# Altium footprint library ICs And Semiconductors SMD.PcbLib: 943 footprints (part 34 of 60)
Each footprint in its own frame and in the unit in brackets; x right, y up, seen from the top. Pads: shape width x height; smd on the part's side, far side on the other; paste and mask are expansions set on the pad; w line width, h text height; cw(c..) or ccw(c..) is an arc to the next point about the centre after c.
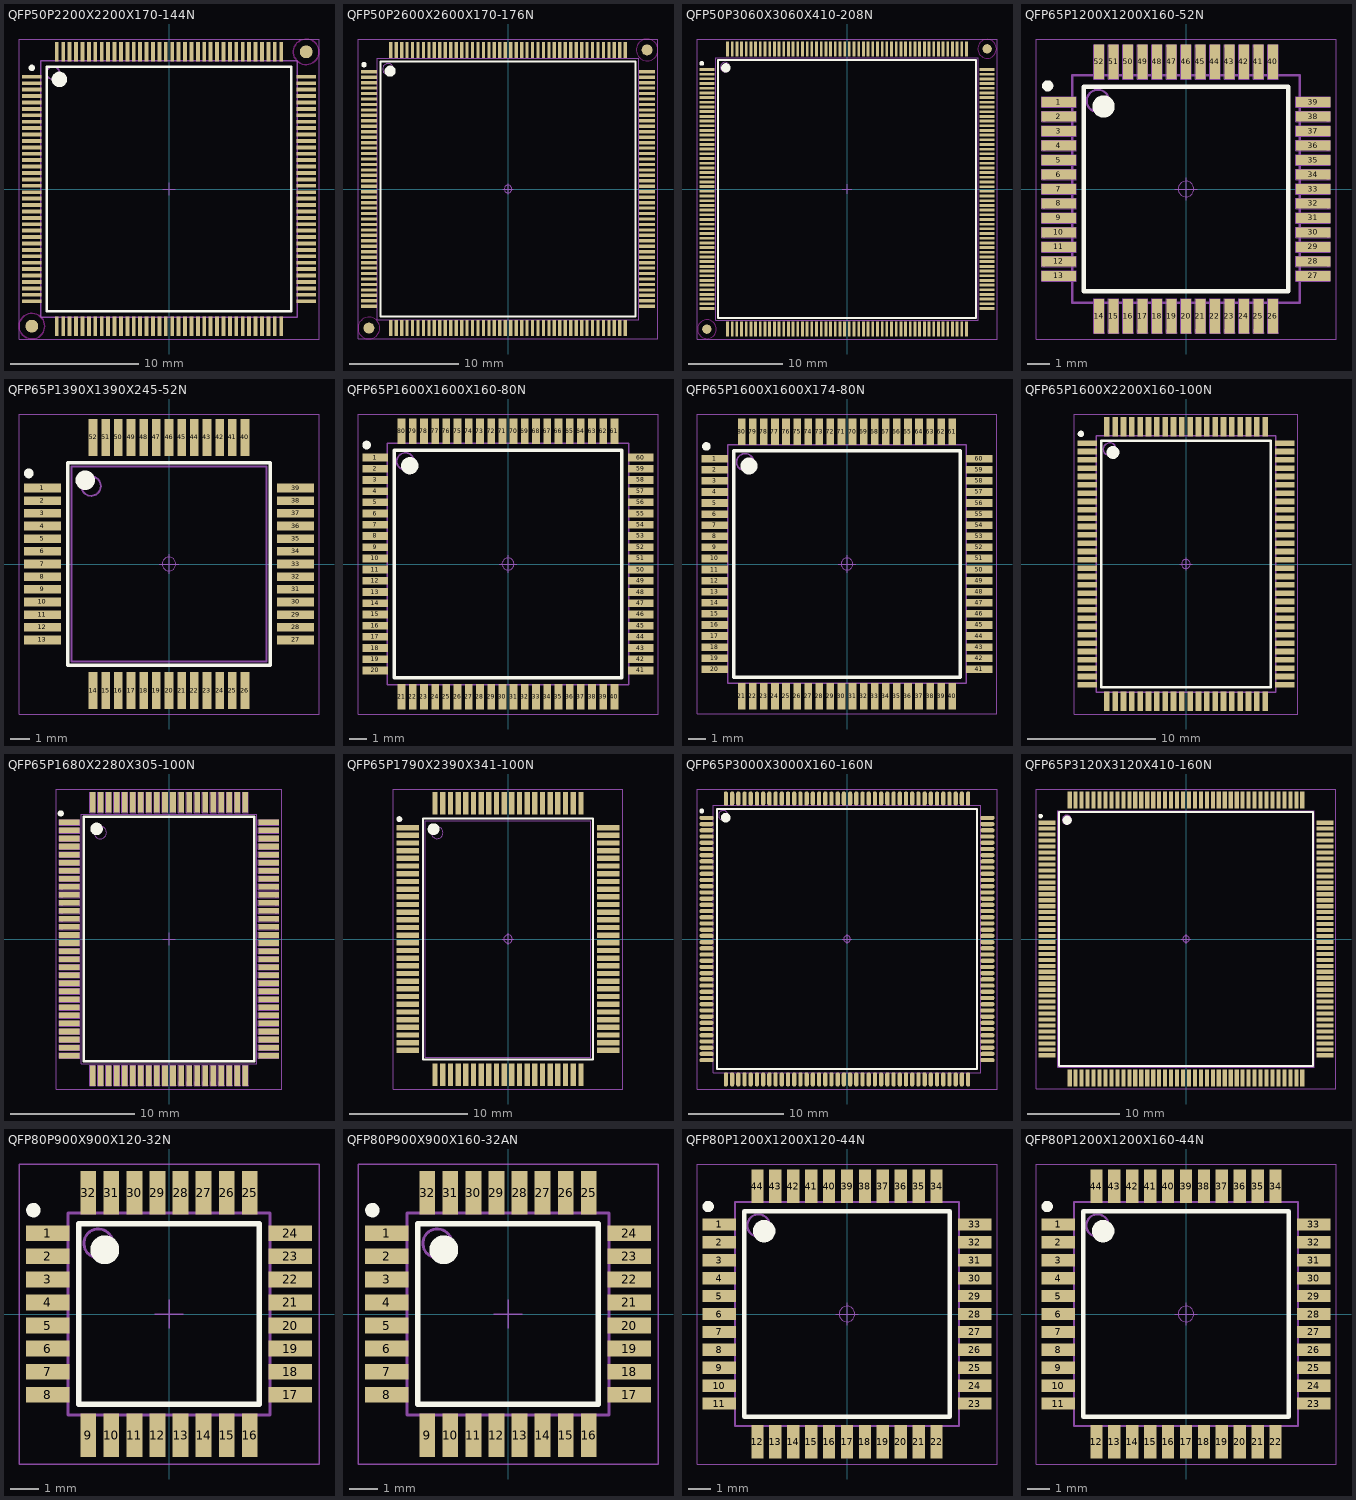
[diagram p33: the footprints below, top view; thin cyan lines are the x and y axes]

## QFP50P2200X2200X170-144N [mm] "QFP, 144-Leads, Body 20x20mm (BSC), Pitch 0.50mm, IPC Medium Density"
height 1.7
pads (146):
  rect 1.5x0.3 smd: 1(-10.7,8.75) 2(-10.7,8.25) 3(-10.7,7.75) 4(-10.7,7.25) 5(-10.7,6.75) 6(-10.7,6.25) 7(-10.7,5.75) 8(-10.7,5.25) 9(-10.7,4.75) 10(-10.7,4.25) 11(-10.7,3.75) 12(-10.7,3.25) 13(-10.7,2.75) 14(-10.7,2.25) 15(-10.7,1.75) 16(-10.7,1.25) 17(-10.7,0.75) 18(-10.7,0.25) 19(-10.7,-0.25) 20(-10.7,-0.75) 21(-10.7,-1.25) 22(-10.7,-1.75) 23(-10.7,-2.25) 24(-10.7,-2.75) 25(-10.7,-3.25) 26(-10.7,-3.75) 27(-10.7,-4.25) 28(-10.7,-4.75) 29(-10.7,-5.25) 30(-10.7,-5.75) 31(-10.7,-6.25) 32(-10.7,-6.75) 33(-10.7,-7.25) 34(-10.7,-7.75) 35(-10.7,-8.25) 36(-10.7,-8.75) 73(10.7,-8.75) 74(10.7,-8.25) 75(10.7,-7.75) 76(10.7,-7.25) 77(10.7,-6.75) 78(10.7,-6.25) 79(10.7,-5.75) 80(10.7,-5.25) 81(10.7,-4.75) 82(10.7,-4.25) 83(10.7,-3.75) 84(10.7,-3.25) 85(10.7,-2.75) 86(10.7,-2.25) 87(10.7,-1.75) 88(10.7,-1.25) 89(10.7,-0.75) 90(10.7,-0.25) 91(10.7,0.25) 92(10.7,0.75) 93(10.7,1.25) 94(10.7,1.75) 95(10.7,2.25) 96(10.7,2.75) 97(10.7,3.25) 98(10.7,3.75) 99(10.7,4.25) 100(10.7,4.75) 101(10.7,5.25) 102(10.7,5.75) 103(10.7,6.25) 104(10.7,6.75) 105(10.7,7.25) 106(10.7,7.75) 107(10.7,8.25) 108(10.7,8.75)
  rect 0.3x1.5 smd: 37(-8.75,-10.7) 38(-8.25,-10.7) 39(-7.75,-10.7) 40(-7.25,-10.7) 41(-6.75,-10.7) 42(-6.25,-10.7) 43(-5.75,-10.7) 44(-5.25,-10.7) 45(-4.75,-10.7) 46(-4.25,-10.7) 47(-3.75,-10.7) 48(-3.25,-10.7) 49(-2.75,-10.7) 50(-2.25,-10.7) 51(-1.75,-10.7) 52(-1.25,-10.7) 53(-0.75,-10.7) 54(-0.25,-10.7) 55(0.25,-10.7) 56(0.75,-10.7) 57(1.25,-10.7) 58(1.75,-10.7) 59(2.25,-10.7) 60(2.75,-10.7) 61(3.25,-10.7) 62(3.75,-10.7) 63(4.25,-10.7) 64(4.75,-10.7) 65(5.25,-10.7) 66(5.75,-10.7) 67(6.25,-10.7) 68(6.75,-10.7) 69(7.25,-10.7) 70(7.75,-10.7) 71(8.25,-10.7) 72(8.75,-10.7) 109(8.75,10.7) 110(8.25,10.7) 111(7.75,10.7) 112(7.25,10.7) 113(6.75,10.7) 114(6.25,10.7) 115(5.75,10.7) 116(5.25,10.7) 117(4.75,10.7) 118(4.25,10.7) 119(3.75,10.7) 120(3.25,10.7) 121(2.75,10.7) 122(2.25,10.7) 123(1.75,10.7) 124(1.25,10.7) 125(0.75,10.7) 126(0.25,10.7) 127(-0.25,10.7) 128(-0.75,10.7) 129(-1.25,10.7) 130(-1.75,10.7) 131(-2.25,10.7) 132(-2.75,10.7) 133(-3.25,10.7) 134(-3.75,10.7) 135(-4.25,10.7) 136(-4.75,10.7) 137(-5.25,10.7) 138(-5.75,10.7) 139(-6.25,10.7) 140(-6.75,10.7) 141(-7.25,10.7) 142(-7.75,10.7) 143(-8.25,10.7) 144(-8.75,10.7)
  round 1 smd paste-0.51 mask+0.5: FTG1(-10.7,-10.7) FTG2(10.7,10.7)
Top Layer keep-out:
  circle w0.1: c10.7,10.7 r1
  circle w0.1: c-10.7,-10.7 r1
Top Overlay:
  circle w0.6: c-8.55,8.55 r0.3
  circle w0.25: c-10.7,9.45 r0.125
  lines w0.2: -9.55,-9.55 9.55,-9.55 9.55,9.55 -9.55,9.55 -9.55,-9.55
Mechanical 14:
  circle w0.1: c-9.05,9.05 r0.5
  lines w0.1: -10,-10 10,-10 10,10 -10,10 -10,-10
Mechanical 15:
  lines w0.05: -0.5,0 0.5,0 ; 0,-0.5 0,0.5 ; -11.7,-11.7 11.7,-11.7 11.7,11.7 -11.7,11.7 -11.7,-11.7
3D body "QFP50P2200X2200X170-144N.stp": height 1.7, standoff 0, extent -11,-11 11,11

## QFP50P2600X2600X170-176N [mm] "QFP, 0.50mm Pitch, Square; 176 Pin, 24.00mm L X 24.00mm W X 1.70mm H Body, IPC Medium Density"
height 1.7
pads (178):
  rect 1.45x0.3 smd: 1(-12.75,10.75) 2(-12.75,10.25) 3(-12.75,9.75) 4(-12.75,9.25) 5(-12.75,8.75) 6(-12.75,8.25) 7(-12.75,7.75) 8(-12.75,7.25) 9(-12.75,6.75) 10(-12.75,6.25) 11(-12.75,5.75) 12(-12.75,5.25) 13(-12.75,4.75) 14(-12.75,4.25) 15(-12.75,3.75) 16(-12.75,3.25) 17(-12.75,2.75) 18(-12.75,2.25) 19(-12.75,1.75) 20(-12.75,1.25) 21(-12.75,0.75) 22(-12.75,0.25) 23(-12.75,-0.25) 24(-12.75,-0.75) 25(-12.75,-1.25) 26(-12.75,-1.75) 27(-12.75,-2.25) 28(-12.75,-2.75) 29(-12.75,-3.25) 30(-12.75,-3.75) 31(-12.75,-4.25) 32(-12.75,-4.75) 33(-12.75,-5.25) 34(-12.75,-5.75) 35(-12.75,-6.25) 36(-12.75,-6.75) 37(-12.75,-7.25) 38(-12.75,-7.75) 39(-12.75,-8.25) 40(-12.75,-8.75) 41(-12.75,-9.25) 42(-12.75,-9.75) 43(-12.75,-10.25) 44(-12.75,-10.75) 89(12.75,-10.75) 90(12.75,-10.25) 91(12.75,-9.75) 92(12.75,-9.25) 93(12.75,-8.75) 94(12.75,-8.25) 95(12.75,-7.75) 96(12.75,-7.25) 97(12.75,-6.75) 98(12.75,-6.25) 99(12.75,-5.75) 100(12.75,-5.25) 101(12.75,-4.75) 102(12.75,-4.25) 103(12.75,-3.75) 104(12.75,-3.25) 105(12.75,-2.75) 106(12.75,-2.25) 107(12.75,-1.75) 108(12.75,-1.25) 109(12.75,-0.75) 110(12.75,-0.25) 111(12.75,0.25) 112(12.75,0.75) 113(12.75,1.25) 114(12.75,1.75) 115(12.75,2.25) 116(12.75,2.75) 117(12.75,3.25) 118(12.75,3.75) 119(12.75,4.25) 120(12.75,4.75) 121(12.75,5.25) 122(12.75,5.75) 123(12.75,6.25) 124(12.75,6.75) 125(12.75,7.25) 126(12.75,7.75) 127(12.75,8.25) 128(12.75,8.75) 129(12.75,9.25) 130(12.75,9.75) 131(12.75,10.25) 132(12.75,10.75)
  rect 0.3x1.45 smd: 45(-10.75,-12.75) 46(-10.25,-12.75) 47(-9.75,-12.75) 48(-9.25,-12.75) 49(-8.75,-12.75) 50(-8.25,-12.75) 51(-7.75,-12.75) 52(-7.25,-12.75) 53(-6.75,-12.75) 54(-6.25,-12.75) 55(-5.75,-12.75) 56(-5.25,-12.75) 57(-4.75,-12.75) 58(-4.25,-12.75) 59(-3.75,-12.75) 60(-3.25,-12.75) 61(-2.75,-12.75) 62(-2.25,-12.75) 63(-1.75,-12.75) 64(-1.25,-12.75) 65(-0.75,-12.75) 66(-0.25,-12.75) 67(0.25,-12.75) 68(0.75,-12.75) 69(1.25,-12.75) 70(1.75,-12.75) 71(2.25,-12.75) 72(2.75,-12.75) 73(3.25,-12.75) 74(3.75,-12.75) 75(4.25,-12.75) 76(4.75,-12.75) 77(5.25,-12.75) 78(5.75,-12.75) 79(6.25,-12.75) 80(6.75,-12.75) 81(7.25,-12.75) 82(7.75,-12.75) 83(8.25,-12.75) 84(8.75,-12.75) 85(9.25,-12.75) 86(9.75,-12.75) 87(10.25,-12.75) 88(10.75,-12.75) 133(10.75,12.75) 134(10.25,12.75) 135(9.75,12.75) 136(9.25,12.75) 137(8.75,12.75) 138(8.25,12.75) 139(7.75,12.75) 140(7.25,12.75) 141(6.75,12.75) 142(6.25,12.75) 143(5.75,12.75) 144(5.25,12.75) 145(4.75,12.75) 146(4.25,12.75) 147(3.75,12.75) 148(3.25,12.75) 149(2.75,12.75) 150(2.25,12.75) 151(1.75,12.75) 152(1.25,12.75) 153(0.75,12.75) 154(0.25,12.75) 155(-0.25,12.75) 156(-0.75,12.75) 157(-1.25,12.75) 158(-1.75,12.75) 159(-2.25,12.75) 160(-2.75,12.75) 161(-3.25,12.75) 162(-3.75,12.75) 163(-4.25,12.75) 164(-4.75,12.75) 165(-5.25,12.75) 166(-5.75,12.75) 167(-6.25,12.75) 168(-6.75,12.75) 169(-7.25,12.75) 170(-7.75,12.75) 171(-8.25,12.75) 172(-8.75,12.75) 173(-9.25,12.75) 174(-9.75,12.75) 175(-10.25,12.75) 176(-10.75,12.75)
  round 1 smd paste-0.51 mask+0.5: FTG1(-12.75,-12.75) FTG2(12.75,12.75)
Top Layer keep-out:
  circle w0.1: c-12.75,-12.75 r1
  circle w0.1: c12.75,12.75 r1
Top Overlay:
  circle w0.5: c-10.8,10.8 r0.25
  circle w0.25: c-13.2,11.4 r0.125
  lines w0.2: -11.7,-11.7 -11.7,11.7 11.7,11.7 11.7,-11.7 -11.7,-11.7
Mechanical 14:
  circle w0.1: c-11,11 r0.5
  lines w0.1: -12,-12 -12,12 12,12 12,-12 -12,-12
Mechanical 15:
  circle w0.05: c0,0 r0.35
  lines w0.05: -0.5,0 0.5,0 ; 0,-0.5 0,0.5 ; -13.75,-13.75 -13.75,13.75 13.75,13.75 13.75,-13.75 -13.75,-13.75
3D body "QFP50P2600X2600X170-176N.stp": height 1.7, standoff 0, extent -13.025,-13.025 13.025,13.025

## QFP50P3060X3060X410-208N [mm] "SQFP, 208-Leads, Body 28x28mm (BSC), Pitch 0.50mm, IPC Medium Density"
height 4.1
pads (210):
  rect 1.6x0.3 smd: 1(-14.95,12.75) 2(-14.95,12.25) 3(-14.95,11.75) 4(-14.95,11.25) 5(-14.95,10.75) 6(-14.95,10.25) 7(-14.95,9.75) 8(-14.95,9.25) 9(-14.95,8.75) 10(-14.95,8.25) 11(-14.95,7.75) 12(-14.95,7.25) 13(-14.95,6.75) 14(-14.95,6.25) 15(-14.95,5.75) 16(-14.95,5.25) 17(-14.95,4.75) 18(-14.95,4.25) 19(-14.95,3.75) 20(-14.95,3.25) 21(-14.95,2.75) 22(-14.95,2.25) 23(-14.95,1.75) 24(-14.95,1.25) 25(-14.95,0.75) 26(-14.95,0.25) 27(-14.95,-0.25) 28(-14.95,-0.75) 29(-14.95,-1.25) 30(-14.95,-1.75) 31(-14.95,-2.25) 32(-14.95,-2.75) 33(-14.95,-3.25) 34(-14.95,-3.75) 35(-14.95,-4.25) 36(-14.95,-4.75) 37(-14.95,-5.25) 38(-14.95,-5.75) 39(-14.95,-6.25) 40(-14.95,-6.75) 41(-14.95,-7.25) 42(-14.95,-7.75) 43(-14.95,-8.25) 44(-14.95,-8.75) 45(-14.95,-9.25) 46(-14.95,-9.75) 47(-14.95,-10.25) 48(-14.95,-10.75) 49(-14.95,-11.25) 50(-14.95,-11.75) 51(-14.95,-12.25) 52(-14.95,-12.75) 105(14.95,-12.75) 106(14.95,-12.25) 107(14.95,-11.75) 108(14.95,-11.25) 109(14.95,-10.75) 110(14.95,-10.25) 111(14.95,-9.75) 112(14.95,-9.25) 113(14.95,-8.75) 114(14.95,-8.25) 115(14.95,-7.75) 116(14.95,-7.25) 117(14.95,-6.75) 118(14.95,-6.25) 119(14.95,-5.75) 120(14.95,-5.25) 121(14.95,-4.75) 122(14.95,-4.25) 123(14.95,-3.75) 124(14.95,-3.25) 125(14.95,-2.75) 126(14.95,-2.25) 127(14.95,-1.75) 128(14.95,-1.25) 129(14.95,-0.75) 130(14.95,-0.25) 131(14.95,0.25) 132(14.95,0.75) 133(14.95,1.25) 134(14.95,1.75) 135(14.95,2.25) 136(14.95,2.75) 137(14.95,3.25) 138(14.95,3.75) 139(14.95,4.25) 140(14.95,4.75) 141(14.95,5.25) 142(14.95,5.75) 143(14.95,6.25) 144(14.95,6.75) 145(14.95,7.25) 146(14.95,7.75) 147(14.95,8.25) 148(14.95,8.75) 149(14.95,9.25) 150(14.95,9.75) 151(14.95,10.25) 152(14.95,10.75) 153(14.95,11.25) 154(14.95,11.75) 155(14.95,12.25) 156(14.95,12.75)
  rect 0.3x1.6 smd: 53(-12.75,-14.95) 54(-12.25,-14.95) 55(-11.75,-14.95) 56(-11.25,-14.95) 57(-10.75,-14.95) 58(-10.25,-14.95) 59(-9.75,-14.95) 60(-9.25,-14.95) 61(-8.75,-14.95) 62(-8.25,-14.95) 63(-7.75,-14.95) 64(-7.25,-14.95) 65(-6.75,-14.95) 66(-6.25,-14.95) 67(-5.75,-14.95) 68(-5.25,-14.95) 69(-4.75,-14.95) 70(-4.25,-14.95) 71(-3.75,-14.95) 72(-3.25,-14.95) 73(-2.75,-14.95) 74(-2.25,-14.95) 75(-1.75,-14.95) 76(-1.25,-14.95) 77(-0.75,-14.95) 78(-0.25,-14.95) 79(0.25,-14.95) 80(0.75,-14.95) 81(1.25,-14.95) 82(1.75,-14.95) 83(2.25,-14.95) 84(2.75,-14.95) 85(3.25,-14.95) 86(3.75,-14.95) 87(4.25,-14.95) 88(4.75,-14.95) 89(5.25,-14.95) 90(5.75,-14.95) 91(6.25,-14.95) 92(6.75,-14.95) 93(7.25,-14.95) 94(7.75,-14.95) 95(8.25,-14.95) 96(8.75,-14.95) 97(9.25,-14.95) 98(9.75,-14.95) 99(10.25,-14.95) 100(10.75,-14.95) 101(11.25,-14.95) 102(11.75,-14.95) 103(12.25,-14.95) 104(12.75,-14.95) 157(12.75,14.95) 158(12.25,14.95) 159(11.75,14.95) 160(11.25,14.95) 161(10.75,14.95) 162(10.25,14.95) 163(9.75,14.95) 164(9.25,14.95) 165(8.75,14.95) 166(8.25,14.95) 167(7.75,14.95) 168(7.25,14.95) 169(6.75,14.95) 170(6.25,14.95) 171(5.75,14.95) 172(5.25,14.95) 173(4.75,14.95) 174(4.25,14.95) 175(3.75,14.95) 176(3.25,14.95) 177(2.75,14.95) 178(2.25,14.95) 179(1.75,14.95) 180(1.25,14.95) 181(0.75,14.95) 182(0.25,14.95) 183(-0.25,14.95) 184(-0.75,14.95) 185(-1.25,14.95) 186(-1.75,14.95) 187(-2.25,14.95) 188(-2.75,14.95) 189(-3.25,14.95) 190(-3.75,14.95) 191(-4.25,14.95) 192(-4.75,14.95) 193(-5.25,14.95) 194(-5.75,14.95) 195(-6.25,14.95) 196(-6.75,14.95) 197(-7.25,14.95) 198(-7.75,14.95) 199(-8.25,14.95) 200(-8.75,14.95) 201(-9.25,14.95) 202(-9.75,14.95) 203(-10.25,14.95) 204(-10.75,14.95) 205(-11.25,14.95) 206(-11.75,14.95) 207(-12.25,14.95) 208(-12.75,14.95)
  round 1 smd paste-0.51 mask+0.5: FTG1(-14.95,-14.95) FTG2(14.95,14.95)
Top Layer keep-out:
  circle w0.1: c14.95,14.95 r1
  circle w0.1: c-14.95,-14.95 r1
Top Overlay:
  circle w0.5: c-12.925,12.925 r0.25
  circle w0.25: c-15.5,13.4 r0.125
  lines w0.2: -13.75,-13.75 -13.75,13.75 13.75,13.75 13.75,-13.75 -13.75,-13.75
Mechanical 14:
  circle w0.1: c-13,13 r0.5
  lines w0.1: -14,-14 -14,14 14,14 14,-14 -14,-14
Mechanical 15:
  lines w0.05: -0.5,0 0.5,0 ; 0,-0.5 0,0.5 ; -16,-16 -16,16 16,16 16,-16 -16,-16
3D body "QFP50P3060X3060X410-208N.stp": height 4.1, standoff 0, extent -15.3,-15.3 15.3,15.3

## QFP65P1200X1200X160-52N [mm] "QFP, 0.65mm PQFP, 0.65mm Pitch, Square, 13 pin X 13 Pin, 12.00mm X 12.00mm X 1.60mm Body, IPC Medium Density"
height 1.6
pads (52):
  rect 1.55x0.45 smd: 1(-5.7,3.9) 2(-5.7,3.25) 3(-5.7,2.6) 4(-5.7,1.95) 5(-5.7,1.3) 6(-5.7,0.65) 7(-5.7,0) 8(-5.7,-0.65) 9(-5.7,-1.3) 10(-5.7,-1.95) 11(-5.7,-2.6) 12(-5.7,-3.25) 13(-5.7,-3.9) 27(5.7,-3.9) 28(5.7,-3.25) 29(5.7,-2.6) 30(5.7,-1.95) 31(5.7,-1.3) 32(5.7,-0.65) 33(5.7,0) 34(5.7,0.65) 35(5.7,1.3) 36(5.7,1.95) 37(5.7,2.6) 38(5.7,3.25) 39(5.7,3.9)
  rect 0.45x1.55 smd: 14(-3.9,-5.7) 15(-3.25,-5.7) 16(-2.6,-5.7) 17(-1.95,-5.7) 18(-1.3,-5.7) 19(-0.65,-5.7) 20(0,-5.7) 21(0.65,-5.7) 22(1.3,-5.7) 23(1.95,-5.7) 24(2.6,-5.7) 25(3.25,-5.7) 26(3.9,-5.7) 40(3.9,5.7) 41(3.25,5.7) 42(2.6,5.7) 43(1.95,5.7) 44(1.3,5.7) 45(0.65,5.7) 46(0,5.7) 47(-0.65,5.7) 48(-1.3,5.7) 49(-1.95,5.7) 50(-2.6,5.7) 51(-3.25,5.7) 52(-3.9,5.7)
Top Overlay:
  circle w0.5: c-3.7,3.7 r0.25
  circle w0.25: c-6.2,4.625 r0.125
  lines w0.2: -4.575,-4.575 -4.575,4.575 4.575,4.575 4.575,-4.575 -4.575,-4.575
Mechanical 8:
  drawing of 316 lines, arcs and shapes, not listed
Mechanical 14:
  circle w0.1: c-3.95,3.95 r0.5
  lines w0.1: -5,-5.1 5.1,-5.1 ; 5.1,-5.1 5.1,5.1 -5.1,5.1 -5.1,-5.1 5.1,-5.1
Mechanical 15:
  circle w0.05: c0,0 r0.35
  lines w0.05: -0.5,0 0.5,0 ; 0,-0.5 0,0.5 ; -6.725,-6.725 -6.725,6.725 6.725,6.725 6.725,-6.725 -6.725,-6.725
3D body "QFP65P1200X1200X160-52N.stp": height 1.6, standoff 0, extent -6.098,-6.098 6.099,6.099

## QFP65P1390X1390X245-52N [mm] "QFP, 0.65mm Pitch, Square; 52 Pin, 10.00mm L X 10.00mm W X 2.45mm H body, IPC Medium Density"
height 2.45
pads (52):
  rect 1.9x0.45 smd: 1(-6.5,3.9) 2(-6.5,3.25) 3(-6.5,2.6) 4(-6.5,1.95) 5(-6.5,1.3) 6(-6.5,0.65) 7(-6.5,0) 8(-6.5,-0.65) 9(-6.5,-1.3) 10(-6.5,-1.95) 11(-6.5,-2.6) 12(-6.5,-3.25) 13(-6.5,-3.9) 27(6.5,-3.9) 28(6.5,-3.25) 29(6.5,-2.6) 30(6.5,-1.95) 31(6.5,-1.3) 32(6.5,-0.65) 33(6.5,0) 34(6.5,0.65) 35(6.5,1.3) 36(6.5,1.95) 37(6.5,2.6) 38(6.5,3.25) 39(6.5,3.9)
  rect 0.45x1.9 smd: 14(-3.9,-6.5) 15(-3.25,-6.5) 16(-2.6,-6.5) 17(-1.95,-6.5) 18(-1.3,-6.5) 19(-0.65,-6.5) 20(0,-6.5) 21(0.65,-6.5) 22(1.3,-6.5) 23(1.95,-6.5) 24(2.6,-6.5) 25(3.25,-6.5) 26(3.9,-6.5) 40(3.9,6.5) 41(3.25,6.5) 42(2.6,6.5) 43(1.95,6.5) 44(1.3,6.5) 45(0.65,6.5) 46(0,6.5) 47(-0.65,6.5) 48(-1.3,6.5) 49(-1.95,6.5) 50(-2.6,6.5) 51(-3.25,6.5) 52(-3.9,6.5)
Top Overlay:
  circle w0.5: c-4.3,4.3 r0.25
  circle w0.25: c-7.2,4.65 r0.125
  lines w0.2: -5.2,-5.2 -5.2,5.2 5.2,5.2 5.2,-5.2 -5.2,-5.2
Mechanical 14:
  circle w0.1: c-4,4 r0.5
  lines w0.1: -5,-5 -5,5 5,5 5,-5 -5,-5
Mechanical 15:
  circle w0.05: c0,0 r0.35
  lines w0.05: -0.5,0 0.5,0 ; 0,-0.5 0,0.5 ; -7.7,-7.7 -7.7,7.7 7.7,7.7 7.7,-7.7 -7.7,-7.7
3D body "QFP65P1390X1390X245-52N.stp": height 2.45, standoff 0, extent -7.075,-7.075 7.075,7.075

## QFP65P1600X1600X160-80N [mm] "QFP, 0.65mm Pitch, Square; 80 Pin,14.00mm L X 14.00mm W X 1.60mm H body, IPC Medium Density"
height 1.6
pads (80):
  rect 1.5x0.45 smd: 1(-7.7,6.175) 2(-7.7,5.525) 3(-7.7,4.875) 4(-7.7,4.225) 5(-7.7,3.575) 6(-7.7,2.925) 7(-7.7,2.275) 8(-7.7,1.625) 9(-7.7,0.975) 10(-7.7,0.325) 11(-7.7,-0.325) 12(-7.7,-0.975) 13(-7.7,-1.625) 14(-7.7,-2.275) 15(-7.7,-2.925) 16(-7.7,-3.575) 17(-7.7,-4.225) 18(-7.7,-4.875) 19(-7.7,-5.525) 20(-7.7,-6.175) 41(7.7,-6.175) 42(7.7,-5.525) 43(7.7,-4.875) 44(7.7,-4.225) 45(7.7,-3.575) 46(7.7,-2.925) 47(7.7,-2.275) 48(7.7,-1.625) 49(7.7,-0.975) 50(7.7,-0.325) 51(7.7,0.325) 52(7.7,0.975) 53(7.7,1.625) 54(7.7,2.275) 55(7.7,2.925) 56(7.7,3.575) 57(7.7,4.225) 58(7.7,4.875) 59(7.7,5.525) 60(7.7,6.175)
  rect 0.45x1.5 smd: 21(-6.175,-7.7) 22(-5.525,-7.7) 23(-4.875,-7.7) 24(-4.225,-7.7) 25(-3.575,-7.7) 26(-2.925,-7.7) 27(-2.275,-7.7) 28(-1.625,-7.7) 29(-0.975,-7.7) 30(-0.325,-7.7) 31(0.325,-7.7) 32(0.975,-7.7) 33(1.625,-7.7) 34(2.275,-7.7) 35(2.925,-7.7) 36(3.575,-7.7) 37(4.225,-7.7) 38(4.875,-7.7) 39(5.525,-7.7) 40(6.175,-7.7) 61(6.175,7.7) 62(5.525,7.7) 63(4.875,7.7) 64(4.225,7.7) 65(3.575,7.7) 66(2.925,7.7) 67(2.275,7.7) 68(1.625,7.7) 69(0.975,7.7) 70(0.325,7.7) 71(-0.325,7.7) 72(-0.975,7.7) 73(-1.625,7.7) 74(-2.275,7.7) 75(-2.925,7.7) 76(-3.575,7.7) 77(-4.225,7.7) 78(-4.875,7.7) 79(-5.525,7.7) 80(-6.175,7.7)
Top Overlay:
  circle w0.25: c-8.2,6.9 r0.125
  circle w0.5: c-5.7,5.7 r0.25
  lines w0.2: -6.6,-6.6 6.6,-6.6 6.6,6.6 -6.6,6.6 -6.6,-6.6
Mechanical 14:
  circle w0.1: c-5.95,5.95 r0.5
  lines w0.1: -7,-7 7,-7 7,7 -7,7 -7,-7
Mechanical 15:
  circle w0.05: c0,0 r0.35
  lines w0.05: -0.5,0 0.5,0 ; 0,-0.5 0,0.5 ; -8.7,-8.7 8.7,-8.7 8.7,8.7 -8.7,8.7 -8.7,-8.7
3D body "QFP65P1600X1600X160-80N.stp": height 1.6, standoff 0, extent -8.023,-8.023 8.024,8.024

## QFP65P1600X1600X174-80N [mm] "QFP, 0.65mm Pitch, Square; 80 Pin, 14.00mm L X 14.00mm W X 1.74mm H Body, IPC Medium Density"
height 1.74
pads (80):
  rect 1.55x0.45 smd: 1(-7.75,6.175) 2(-7.75,5.525) 3(-7.75,4.875) 4(-7.75,4.225) 5(-7.75,3.575) 6(-7.75,2.925) 7(-7.75,2.275) 8(-7.75,1.625) 9(-7.75,0.975) 10(-7.75,0.325) 11(-7.75,-0.325) 12(-7.75,-0.975) 13(-7.75,-1.625) 14(-7.75,-2.275) 15(-7.75,-2.925) 16(-7.75,-3.575) 17(-7.75,-4.225) 18(-7.75,-4.875) 19(-7.75,-5.525) 20(-7.75,-6.175) 41(7.75,-6.175) 42(7.75,-5.525) 43(7.75,-4.875) 44(7.75,-4.225) 45(7.75,-3.575) 46(7.75,-2.925) 47(7.75,-2.275) 48(7.75,-1.625) 49(7.75,-0.975) 50(7.75,-0.325) 51(7.75,0.325) 52(7.75,0.975) 53(7.75,1.625) 54(7.75,2.275) 55(7.75,2.925) 56(7.75,3.575) 57(7.75,4.225) 58(7.75,4.875) 59(7.75,5.525) 60(7.75,6.175)
  rect 0.45x1.55 smd: 21(-6.175,-7.75) 22(-5.525,-7.75) 23(-4.875,-7.75) 24(-4.225,-7.75) 25(-3.575,-7.75) 26(-2.925,-7.75) 27(-2.275,-7.75) 28(-1.625,-7.75) 29(-0.975,-7.75) 30(-0.325,-7.75) 31(0.325,-7.75) 32(0.975,-7.75) 33(1.625,-7.75) 34(2.275,-7.75) 35(2.925,-7.75) 36(3.575,-7.75) 37(4.225,-7.75) 38(4.875,-7.75) 39(5.525,-7.75) 40(6.175,-7.75) 61(6.175,7.75) 62(5.525,7.75) 63(4.875,7.75) 64(4.225,7.75) 65(3.575,7.75) 66(2.925,7.75) 67(2.275,7.75) 68(1.625,7.75) 69(0.975,7.75) 70(0.325,7.75) 71(-0.325,7.75) 72(-0.975,7.75) 73(-1.625,7.75) 74(-2.275,7.75) 75(-2.925,7.75) 76(-3.575,7.75) 77(-4.225,7.75) 78(-4.875,7.75) 79(-5.525,7.75) 80(-6.175,7.75)
Top Overlay:
  circle w0.5: c-5.75,5.75 r0.25
  circle w0.25: c-8.25,6.9 r0.125
  lines w0.2: -6.65,-6.65 -6.65,6.65 6.65,6.65 6.65,-6.65 -6.65,-6.65
Mechanical 14:
  circle w0.1: c-5.975,5.975 r0.5
  lines w0.1: -7,-7 -7,7 7,7 7,-7 -7,-7
Mechanical 15:
  circle w0.05: c0,0 r0.35
  lines w0.05: -0.5,0 0.5,0 ; 0,-0.5 0,0.5 ; -8.8,-8.8 -8.8,8.8 8.8,8.8 8.8,-8.8 -8.8,-8.8
3D body "QFP65P1600X1600X174-80N.stp": height 1.74, standoff 0, extent -8.023,-8.023 8.024,8.024

## QFP65P1600X2200X160-100N [mm] "QFP, 0.65mm Pitch, Rect.; 100 Pin, 20.00mm L X 14.00mm W X 1.60mm H body, IPC Medium Density"
height 1.6
pads (100):
  rect 1.5x0.45 smd: 1(-7.7,9.425) 2(-7.7,8.775) 3(-7.7,8.125) 4(-7.7,7.475) 5(-7.7,6.825) 6(-7.7,6.175) 7(-7.7,5.525) 8(-7.7,4.875) 9(-7.7,4.225) 10(-7.7,3.575) 11(-7.7,2.925) 12(-7.7,2.275) 13(-7.7,1.625) 14(-7.7,0.975) 15(-7.7,0.325) 16(-7.7,-0.325) 17(-7.7,-0.975) 18(-7.7,-1.625) 19(-7.7,-2.275) 20(-7.7,-2.925) 21(-7.7,-3.575) 22(-7.7,-4.225) 23(-7.7,-4.875) 24(-7.7,-5.525) 25(-7.7,-6.175) 26(-7.7,-6.825) 27(-7.7,-7.475) 28(-7.7,-8.125) 29(-7.7,-8.775) 30(-7.7,-9.425) 51(7.7,-9.425) 52(7.7,-8.775) 53(7.7,-8.125) 54(7.7,-7.475) 55(7.7,-6.825) 56(7.7,-6.175) 57(7.7,-5.525) 58(7.7,-4.875) 59(7.7,-4.225) 60(7.7,-3.575) 61(7.7,-2.925) 62(7.7,-2.275) 63(7.7,-1.625) 64(7.7,-0.975) 65(7.7,-0.325) 66(7.7,0.325) 67(7.7,0.975) 68(7.7,1.625) 69(7.7,2.275) 70(7.7,2.925) 71(7.7,3.575) 72(7.7,4.225) 73(7.7,4.875) 74(7.7,5.525) 75(7.7,6.175) 76(7.7,6.825) 77(7.7,7.475) 78(7.7,8.125) 79(7.7,8.775) 80(7.7,9.425)
  rect 0.45x1.5 smd: 31(-6.175,-10.7) 32(-5.525,-10.7) 33(-4.875,-10.7) 34(-4.225,-10.7) 35(-3.575,-10.7) 36(-2.925,-10.7) 37(-2.275,-10.7) 38(-1.625,-10.7) 39(-0.975,-10.7) 40(-0.325,-10.7) 41(0.325,-10.7) 42(0.975,-10.7) 43(1.625,-10.7) 44(2.275,-10.7) 45(2.925,-10.7) 46(3.575,-10.7) 47(4.225,-10.7) 48(4.875,-10.7) 49(5.525,-10.7) 50(6.175,-10.7) 81(6.175,10.7) 82(5.525,10.7) 83(4.875,10.7) 84(4.225,10.7) 85(3.575,10.7) 86(2.925,10.7) 87(2.275,10.7) 88(1.625,10.7) 89(0.975,10.7) 90(0.325,10.7) 91(-0.325,10.7) 92(-0.975,10.7) 93(-1.625,10.7) 94(-2.275,10.7) 95(-2.925,10.7) 96(-3.575,10.7) 97(-4.225,10.7) 98(-4.875,10.7) 99(-5.525,10.7) 100(-6.175,10.7)
Top Overlay:
  circle w0.5: c-5.7,8.7 r0.25
  circle w0.25: c-8.2,10.15 r0.125
  lines w0.2: -6.6,-9.6 6.6,-9.6 6.6,9.6 -6.6,9.6 -6.6,-9.6
Mechanical 14:
  circle w0.1: c-5.95,8.95 r0.5
  lines w0.1: -7,-10 7,-10 7,10 -7,10 -7,-10
Mechanical 15:
  circle w0.05: c0,0 r0.35
  lines w0.05: -0.5,0 0.5,0 ; 0,-0.5 0,0.5 ; -8.7,-11.7 8.7,-11.7 8.7,11.7 -8.7,11.7 -8.7,-11.7
3D body "QFP65P1600X2200X160-100N.stp": height 1.55, standoff 0, extent -8.023,-11.023 8.024,11.024

## QFP65P1680X2280X305-100N [mm] "QFP, 0.65mm Pitch, Rect.; 100 Pin,20.00mm L X 14.00mm W X 3.05mm H Body, IPC Medium Density"
height 3.05
pads (100):
  rect 1.65x0.45 smd: 1(-8.05,9.425) 2(-8.05,8.775) 3(-8.05,8.125) 4(-8.05,7.475) 5(-8.05,6.825) 6(-8.05,6.175) 7(-8.05,5.525) 8(-8.05,4.875) 9(-8.05,4.225) 10(-8.05,3.575) 11(-8.05,2.925) 12(-8.05,2.275) 13(-8.05,1.625) 14(-8.05,0.975) 15(-8.05,0.325) 16(-8.05,-0.325) 17(-8.05,-0.975) 18(-8.05,-1.625) 19(-8.05,-2.275) 20(-8.05,-2.925) 21(-8.05,-3.575) 22(-8.05,-4.225) 23(-8.05,-4.875) 24(-8.05,-5.525) 25(-8.05,-6.175) 26(-8.05,-6.825) 27(-8.05,-7.475) 28(-8.05,-8.125) 29(-8.05,-8.775) 30(-8.05,-9.425) 51(8.05,-9.425) 52(8.05,-8.775) 53(8.05,-8.125) 54(8.05,-7.475) 55(8.05,-6.825) 56(8.05,-6.175) 57(8.05,-5.525) 58(8.05,-4.875) 59(8.05,-4.225) 60(8.05,-3.575) 61(8.05,-2.925) 62(8.05,-2.275) 63(8.05,-1.625) 64(8.05,-0.975) 65(8.05,-0.325) 66(8.05,0.325) 67(8.05,0.975) 68(8.05,1.625) 69(8.05,2.275) 70(8.05,2.925) 71(8.05,3.575) 72(8.05,4.225) 73(8.05,4.875) 74(8.05,5.525) 75(8.05,6.175) 76(8.05,6.825) 77(8.05,7.475) 78(8.05,8.125) 79(8.05,8.775) 80(8.05,9.425)
  rect 0.45x1.65 smd: 31(-6.175,-11.05) 32(-5.525,-11.05) 33(-4.875,-11.05) 34(-4.225,-11.05) 35(-3.575,-11.05) 36(-2.925,-11.05) 37(-2.275,-11.05) 38(-1.625,-11.05) 39(-0.975,-11.05) 40(-0.325,-11.05) 41(0.325,-11.05) 42(0.975,-11.05) 43(1.625,-11.05) 44(2.275,-11.05) 45(2.925,-11.05) 46(3.575,-11.05) 47(4.225,-11.05) 48(4.875,-11.05) 49(5.525,-11.05) 50(6.175,-11.05) 81(6.175,11.05) 82(5.525,11.05) 83(4.875,11.05) 84(4.225,11.05) 85(3.575,11.05) 86(2.925,11.05) 87(2.275,11.05) 88(1.625,11.05) 89(0.975,11.05) 90(0.325,11.05) 91(-0.325,11.05) 92(-0.975,11.05) 93(-1.625,11.05) 94(-2.275,11.05) 95(-2.925,11.05) 96(-3.575,11.05) 97(-4.225,11.05) 98(-4.875,11.05) 99(-5.525,11.05) 100(-6.175,11.05)
Top Overlay:
  circle w0.5: c-5.85,8.9 r0.25
  circle w0.25: c-8.75,10.15 r0.125
  lines w0.2: -6.875,-9.875 6.875,-9.875 6.875,9.875 -6.875,9.875 -6.875,-9.875
Mechanical 8:
  drawing of 604 lines, arcs and shapes, not listed
Mechanical 14:
  circle w0.1: c-5.55,8.6 r0.5
  lines w0.1: -7.1,-10.1 -7.1,10.1 7.1,10.1 7.1,-10.1 -7.1,-10.1
Mechanical 15:
  lines w0.05: -9.125,-12.125 9.125,-12.125 9.125,12.125 -9.125,12.125 -9.125,-12.125
3D body "QFP65P1680X2280X305-100N.stp": height 3.05, standoff 0, extent -8.46,-11.46 8.461,11.461

## QFP65P1790X2390X341-100N [mm] "QFP, 0.65mm Pitch, Rect.; 100 Pin,20.00mm L X 14.00mm W X 3.41mm H Body, IPC Medium Density"
height 3.41
pads (100):
  rect 1.9x0.45 smd: 1(-8.5,9.425) 2(-8.5,8.775) 3(-8.5,8.125) 4(-8.5,7.475) 5(-8.5,6.825) 6(-8.5,6.175) 7(-8.5,5.525) 8(-8.5,4.875) 9(-8.5,4.225) 10(-8.5,3.575) 11(-8.5,2.925) 12(-8.5,2.275) 13(-8.5,1.625) 14(-8.5,0.975) 15(-8.5,0.325) 16(-8.5,-0.325) 17(-8.5,-0.975) 18(-8.5,-1.625) 19(-8.5,-2.275) 20(-8.5,-2.925) 21(-8.5,-3.575) 22(-8.5,-4.225) 23(-8.5,-4.875) 24(-8.5,-5.525) 25(-8.5,-6.175) 26(-8.5,-6.825) 27(-8.5,-7.475) 28(-8.5,-8.125) 29(-8.5,-8.775) 30(-8.5,-9.425) 51(8.5,-9.425) 52(8.5,-8.775) 53(8.5,-8.125) 54(8.5,-7.475) 55(8.5,-6.825) 56(8.5,-6.175) 57(8.5,-5.525) 58(8.5,-4.875) 59(8.5,-4.225) 60(8.5,-3.575) 61(8.5,-2.925) 62(8.5,-2.275) 63(8.5,-1.625) 64(8.5,-0.975) 65(8.5,-0.325) 66(8.5,0.325) 67(8.5,0.975) 68(8.5,1.625) 69(8.5,2.275) 70(8.5,2.925) 71(8.5,3.575) 72(8.5,4.225) 73(8.5,4.875) 74(8.5,5.525) 75(8.5,6.175) 76(8.5,6.825) 77(8.5,7.475) 78(8.5,8.125) 79(8.5,8.775) 80(8.5,9.425)
  rect 0.45x1.9 smd: 31(-6.175,-11.5) 32(-5.525,-11.5) 33(-4.875,-11.5) 34(-4.225,-11.5) 35(-3.575,-11.5) 36(-2.925,-11.5) 37(-2.275,-11.5) 38(-1.625,-11.5) 39(-0.975,-11.5) 40(-0.325,-11.5) 41(0.325,-11.5) 42(0.975,-11.5) 43(1.625,-11.5) 44(2.275,-11.5) 45(2.925,-11.5) 46(3.575,-11.5) 47(4.225,-11.5) 48(4.875,-11.5) 49(5.525,-11.5) 50(6.175,-11.5) 81(6.175,11.5) 82(5.525,11.5) 83(4.875,11.5) 84(4.225,11.5) 85(3.575,11.5) 86(2.925,11.5) 87(2.275,11.5) 88(1.625,11.5) 89(0.975,11.5) 90(0.325,11.5) 91(-0.325,11.5) 92(-0.975,11.5) 93(-1.625,11.5) 94(-2.275,11.5) 95(-2.925,11.5) 96(-3.575,11.5) 97(-4.225,11.5) 98(-4.875,11.5) 99(-5.525,11.5) 100(-6.175,11.5)
Top Overlay:
  circle w0.25: c-9.2,10.15 r0.125
  circle w0.5: c-6.3,9.3 r0.25
  lines w0.2: -7.2,-10.2 -7.2,10.2 7.2,10.2 7.2,-10.2 -7.2,-10.2
Mechanical 14:
  circle w0.1: c-6,9 r0.5
  lines w0.1: -7,-10 -7,10 7,10 7,-10 -7,-10
Mechanical 15:
  circle w0.05: c0,0 r0.35
  lines w0.05: -0.5,0 0.5,0 ; 0,-0.5 0,0.5 ; -9.7,-12.7 -9.7,12.7 9.7,12.7 9.7,-12.7 -9.7,-12.7
3D body "QFP65P1790X2390X341-100N.stp": height 3.41, standoff 0, extent -8.96,-11.96 8.961,11.961

## QFP65P3000X3000X160-160N [mm] "QFP, 0.65mm pitch, square; 160 pin, 28.00mm L X 28.00mm W X 1.60mm H body, IPC Medium Density"
height 1.6
pads (160):
  oval 1.5x0.45 smd: 1(-14.7,12.675) 2(-14.7,12.025) 3(-14.7,11.375) 4(-14.7,10.725) 5(-14.7,10.075) 6(-14.7,9.425) 7(-14.7,8.775) 8(-14.7,8.125) 9(-14.7,7.475) 10(-14.7,6.825) 11(-14.7,6.175) 12(-14.7,5.525) 13(-14.7,4.875) 14(-14.7,4.225) 15(-14.7,3.575) 16(-14.7,2.925) 17(-14.7,2.275) 18(-14.7,1.625) 19(-14.7,0.975) 20(-14.7,0.325) 21(-14.7,-0.325) 22(-14.7,-0.975) 23(-14.7,-1.625) 24(-14.7,-2.275) 25(-14.7,-2.925) 26(-14.7,-3.575) 27(-14.7,-4.225) 28(-14.7,-4.875) 29(-14.7,-5.525) 30(-14.7,-6.175) 31(-14.7,-6.825) 32(-14.7,-7.475) 33(-14.7,-8.125) 34(-14.7,-8.775) 35(-14.7,-9.425) 36(-14.7,-10.075) 37(-14.7,-10.725) 38(-14.7,-11.375) 39(-14.7,-12.025) 40(-14.7,-12.675) 81(14.7,-12.675) 82(14.7,-12.025) 83(14.7,-11.375) 84(14.7,-10.725) 85(14.7,-10.075) 86(14.7,-9.425) 87(14.7,-8.775) 88(14.7,-8.125) 89(14.7,-7.475) 90(14.7,-6.825) 91(14.7,-6.175) 92(14.7,-5.525) 93(14.7,-4.875) 94(14.7,-4.225) 95(14.7,-3.575) 96(14.7,-2.925) 97(14.7,-2.275) 98(14.7,-1.625) 99(14.7,-0.975) 100(14.7,-0.325) 101(14.7,0.325) 102(14.7,0.975) 103(14.7,1.625) 104(14.7,2.275) 105(14.7,2.925) 106(14.7,3.575) 107(14.7,4.225) 108(14.7,4.875) 109(14.7,5.525) 110(14.7,6.175) 111(14.7,6.825) 112(14.7,7.475) 113(14.7,8.125) 114(14.7,8.775) 115(14.7,9.425) 116(14.7,10.075) 117(14.7,10.725) 118(14.7,11.375) 119(14.7,12.025) 120(14.7,12.675)
  oval 0.45x1.5 smd: 41(-12.675,-14.7) 42(-12.025,-14.7) 43(-11.375,-14.7) 44(-10.725,-14.7) 45(-10.075,-14.7) 46(-9.425,-14.7) 47(-8.775,-14.7) 48(-8.125,-14.7) 49(-7.475,-14.7) 50(-6.825,-14.7) 51(-6.175,-14.7) 52(-5.525,-14.7) 53(-4.875,-14.7) 54(-4.225,-14.7) 55(-3.575,-14.7) 56(-2.925,-14.7) 57(-2.275,-14.7) 58(-1.625,-14.7) 59(-0.975,-14.7) 60(-0.325,-14.7) 61(0.325,-14.7) 62(0.975,-14.7) 63(1.625,-14.7) 64(2.275,-14.7) 65(2.925,-14.7) 66(3.575,-14.7) 67(4.225,-14.7) 68(4.875,-14.7) 69(5.525,-14.7) 70(6.175,-14.7) 71(6.825,-14.7) 72(7.475,-14.7) 73(8.125,-14.7) 74(8.775,-14.7) 75(9.425,-14.7) 76(10.075,-14.7) 77(10.725,-14.7) 78(11.375,-14.7) 79(12.025,-14.7) 80(12.675,-14.7) 121(12.675,14.7) 122(12.025,14.7) 123(11.375,14.7) 124(10.725,14.7) 125(10.075,14.7) 126(9.425,14.7) 127(8.775,14.7) 128(8.125,14.7) 129(7.475,14.7) 130(6.825,14.7) 131(6.175,14.7) 132(5.525,14.7) 133(4.875,14.7) 134(4.225,14.7) 135(3.575,14.7) 136(2.925,14.7) 137(2.275,14.7) 138(1.625,14.7) 139(0.975,14.7) 140(0.325,14.7) 141(-0.325,14.7) 142(-0.975,14.7) 143(-1.625,14.7) 144(-2.275,14.7) 145(-2.925,14.7) 146(-3.575,14.7) 147(-4.225,14.7) 148(-4.875,14.7) 149(-5.525,14.7) 150(-6.175,14.7) 151(-6.825,14.7) 152(-7.475,14.7) 153(-8.125,14.7) 154(-8.775,14.7) 155(-9.425,14.7) 156(-10.075,14.7) 157(-10.725,14.7) 158(-11.375,14.7) 159(-12.025,14.7) 160(-12.675,14.7)
Top Overlay:
  circle w0.5: c-12.7,12.7 r0.25
  circle w0.25: c-15.2,13.4 r0.125
  lines w0.2: -13.6,-13.6 -13.6,13.6 13.6,13.6 13.6,-13.6 -13.6,-13.6
Mechanical 8:
  lines w0.001: -14,-14 -14,14 14,14 14,-14 -14,-14
Mechanical 14:
  circle w0.1: c-12.95,12.95 r0.5
  lines w0.1: -14,-14 -14,14 14,14 14,-14 -14,-14
Mechanical 15:
  circle w0.05: c0,0 r0.35
  lines w0.05: -0.5,0 0.5,0 ; 0,-0.5 0,0.5 ; -15.7,-15.7 -15.7,15.7 15.7,15.7 15.7,-15.7 -15.7,-15.7
3D body "QFP65P3000X3000X160-160N.stp": height 1.6, standoff 0, extent -15.023,-15.023 15.024,15.024

## QFP65P3120X3120X410-160N [mm] "QFP, 0.65mm pitch, square; 160 pin, 28.00mm L X 28.00mm W X 4.10mm H body, IPC Medium Density"
height 4.1
pads (160):
  rect 1.9x0.45 smd: 1(-15.15,12.675) 2(-15.15,12.025) 3(-15.15,11.375) 4(-15.15,10.725) 5(-15.15,10.075) 6(-15.15,9.425) 7(-15.15,8.775) 8(-15.15,8.125) 9(-15.15,7.475) 10(-15.15,6.825) 11(-15.15,6.175) 12(-15.15,5.525) 13(-15.15,4.875) 14(-15.15,4.225) 15(-15.15,3.575) 16(-15.15,2.925) 17(-15.15,2.275) 18(-15.15,1.625) 19(-15.15,0.975) 20(-15.15,0.325) 21(-15.15,-0.325) 22(-15.15,-0.975) 23(-15.15,-1.625) 24(-15.15,-2.275) 25(-15.15,-2.925) 26(-15.15,-3.575) 27(-15.15,-4.225) 28(-15.15,-4.875) 29(-15.15,-5.525) 30(-15.15,-6.175) 31(-15.15,-6.825) 32(-15.15,-7.475) 33(-15.15,-8.125) 34(-15.15,-8.775) 35(-15.15,-9.425) 36(-15.15,-10.075) 37(-15.15,-10.725) 38(-15.15,-11.375) 39(-15.15,-12.025) 40(-15.15,-12.675) 81(15.15,-12.675) 82(15.15,-12.025) 83(15.15,-11.375) 84(15.15,-10.725) 85(15.15,-10.075) 86(15.15,-9.425) 87(15.15,-8.775) 88(15.15,-8.125) 89(15.15,-7.475) 90(15.15,-6.825) 91(15.15,-6.175) 92(15.15,-5.525) 93(15.15,-4.875) 94(15.15,-4.225) 95(15.15,-3.575) 96(15.15,-2.925) 97(15.15,-2.275) 98(15.15,-1.625) 99(15.15,-0.975) 100(15.15,-0.325) 101(15.15,0.325) 102(15.15,0.975) 103(15.15,1.625) 104(15.15,2.275) 105(15.15,2.925) 106(15.15,3.575) 107(15.15,4.225) 108(15.15,4.875) 109(15.15,5.525) 110(15.15,6.175) 111(15.15,6.825) 112(15.15,7.475) 113(15.15,8.125) 114(15.15,8.775) 115(15.15,9.425) 116(15.15,10.075) 117(15.15,10.725) 118(15.15,11.375) 119(15.15,12.025) 120(15.15,12.675)
  rect 0.45x1.9 smd: 41(-12.675,-15.15) 42(-12.025,-15.15) 43(-11.375,-15.15) 44(-10.725,-15.15) 45(-10.075,-15.15) 46(-9.425,-15.15) 47(-8.775,-15.15) 48(-8.125,-15.15) 49(-7.475,-15.15) 50(-6.825,-15.15) 51(-6.175,-15.15) 52(-5.525,-15.15) 53(-4.875,-15.15) 54(-4.225,-15.15) 55(-3.575,-15.15) 56(-2.925,-15.15) 57(-2.275,-15.15) 58(-1.625,-15.15) 59(-0.975,-15.15) 60(-0.325,-15.15) 61(0.325,-15.15) 62(0.975,-15.15) 63(1.625,-15.15) 64(2.275,-15.15) 65(2.925,-15.15) 66(3.575,-15.15) 67(4.225,-15.15) 68(4.875,-15.15) 69(5.525,-15.15) 70(6.175,-15.15) 71(6.825,-15.15) 72(7.475,-15.15) 73(8.125,-15.15) 74(8.775,-15.15) 75(9.425,-15.15) 76(10.075,-15.15) 77(10.725,-15.15) 78(11.375,-15.15) 79(12.025,-15.15) 80(12.675,-15.15) 121(12.675,15.15) 122(12.025,15.15) 123(11.375,15.15) 124(10.725,15.15) 125(10.075,15.15) 126(9.425,15.15) 127(8.775,15.15) 128(8.125,15.15) 129(7.475,15.15) 130(6.825,15.15) 131(6.175,15.15) 132(5.525,15.15) 133(4.875,15.15) 134(4.225,15.15) 135(3.575,15.15) 136(2.925,15.15) 137(2.275,15.15) 138(1.625,15.15) 139(0.975,15.15) 140(0.325,15.15) 141(-0.325,15.15) 142(-0.975,15.15) 143(-1.625,15.15) 144(-2.275,15.15) 145(-2.925,15.15) 146(-3.575,15.15) 147(-4.225,15.15) 148(-4.875,15.15) 149(-5.525,15.15) 150(-6.175,15.15) 151(-6.825,15.15) 152(-7.475,15.15) 153(-8.125,15.15) 154(-8.775,15.15) 155(-9.425,15.15) 156(-10.075,15.15) 157(-10.725,15.15) 158(-11.375,15.15) 159(-12.025,15.15) 160(-12.675,15.15)
Top Overlay:
  circle w0.25: c-15.85,13.4 r0.125
  circle w0.5: c-12.95,12.95 r0.25
  lines w0.2: -13.85,-13.85 13.85,-13.85 13.85,13.85 -13.85,13.85 -13.85,-13.85
Mechanical 14:
  circle w0.1: c-13,13 r0.5
  lines w0.1: -14,-14 14,-14 14,14 -14,14 -14,-14
Mechanical 15:
  circle w0.05: c0,0 r0.35
  lines w0.05: -0.5,0 0.5,0 ; 0,-0.5 0,0.5 ; -16.35,-16.35 16.35,-16.35 16.35,16.35 -16.35,16.35 -16.35,-16.35
3D body "QFP65P3120X3120X410-160N.stp": height 4.1, standoff 0.05, extent -15.6,-15.6 15.6,15.6

## QFP80P900X900X120-32N [mm] "QFP,0.80mm Pitch, Square; 32 Pin, 7.00mm L X 7.00mm W X 1.20mm H Body, IPC Medium Density"
height 1.2
pads (32):
  rect 1.5x0.55 smd: 1(-4.2,2.8) 2(-4.2,2) 3(-4.2,1.2) 4(-4.2,0.4) 5(-4.2,-0.4) 6(-4.2,-1.2) 7(-4.2,-2) 8(-4.2,-2.8) 17(4.2,-2.8) 18(4.2,-2) 19(4.2,-1.2) 20(4.2,-0.4) 21(4.2,0.4) 22(4.2,1.2) 23(4.2,2) 24(4.2,2.8)
  rect 0.55x1.5 smd: 9(-2.8,-4.2) 10(-2,-4.2) 11(-1.2,-4.2) 12(-0.4,-4.2) 13(0.4,-4.2) 14(1.2,-4.2) 15(2,-4.2) 16(2.8,-4.2) 25(2.8,4.2) 26(2,4.2) 27(1.2,4.2) 28(0.4,4.2) 29(-0.4,4.2) 30(-1.2,4.2) 31(-2,4.2) 32(-2.8,4.2)
Top Overlay:
  circle w0.25: c-4.7,3.6 r0.125
  circle w0.5: c-2.225,2.225 r0.25
  lines w0.2: -3.125,-3.125 3.125,-3.125 3.125,3.125 -3.125,3.125 -3.125,-3.125
Mechanical 14:
  circle w0.1: c-2.45,2.45 r0.5
  lines w0.1: -3.5,-3.5 3.5,-3.5 3.5,3.5 -3.5,3.5 -3.5,-3.5
Mechanical 15:
  lines w0.05: -0.5,0 0.5,0 ; 0,-0.5 0,0.5 ; -5.2,-5.2 5.2,-5.2 5.2,5.2 -5.2,5.2 -5.2,-5.2
3D body "QFP80P900X900X120-32N.stp": height 1.2, standoff 0, extent -4.624,-4.624 4.624,4.624

## QFP80P900X900X160-32AN [mm] "QFP,0.80mm Pitch, Square; 32 Pin, 7.00mm L X 7.00mm W X 1.60mm H Body, IPC Medium Density"
height 1.6
pads (32):
  rect 1.5x0.55 smd: 1(-4.2,2.8) 2(-4.2,2) 3(-4.2,1.2) 4(-4.2,0.4) 5(-4.2,-0.4) 6(-4.2,-1.2) 7(-4.2,-2) 8(-4.2,-2.8) 17(4.2,-2.8) 18(4.2,-2) 19(4.2,-1.2) 20(4.2,-0.4) 21(4.2,0.4) 22(4.2,1.2) 23(4.2,2) 24(4.2,2.8)
  rect 0.55x1.5 smd: 9(-2.8,-4.2) 10(-2,-4.2) 11(-1.2,-4.2) 12(-0.4,-4.2) 13(0.4,-4.2) 14(1.2,-4.2) 15(2,-4.2) 16(2.8,-4.2) 25(2.8,4.2) 26(2,4.2) 27(1.2,4.2) 28(0.4,4.2) 29(-0.4,4.2) 30(-1.2,4.2) 31(-2,4.2) 32(-2.8,4.2)
Top Overlay:
  circle w0.5: c-2.225,2.225 r0.25
  circle w0.25: c-4.7,3.6 r0.125
  lines w0.2: -3.125,-3.125 -3.125,3.125 3.125,3.125 3.125,-3.125 -3.125,-3.125
Mechanical 14:
  circle w0.1: c-2.45,2.45 r0.5
  lines w0.1: -3.5,-3.5 -3.5,3.5 3.5,3.5 3.5,-3.5 -3.5,-3.5
Mechanical 15:
  lines w0.05: -0.5,0 0.5,0 ; 0,-0.5 0,0.5 ; -5.2,-5.2 -5.2,5.2 5.2,5.2 5.2,-5.2 -5.2,-5.2
3D body "QFP80P900X900X160-32N.stp": height 1.6, standoff 0, extent -4.624,-4.624 4.624,4.624

## QFP80P1200X1200X120-44N [mm] "QFP, 0.80mm Pitch, Square; 44 Pin,10.00mm L X 10.00mm W X 1.20mm H body, IPC Medium Density"
height 1.2
pads (44):
  rect 1.5x0.55 smd: 1(-5.7,4) 2(-5.7,3.2) 3(-5.7,2.4) 4(-5.7,1.6) 5(-5.7,0.8) 6(-5.7,0) 7(-5.7,-0.8) 8(-5.7,-1.6) 9(-5.7,-2.4) 10(-5.7,-3.2) 11(-5.7,-4) 23(5.7,-4) 24(5.7,-3.2) 25(5.7,-2.4) 26(5.7,-1.6) 27(5.7,-0.8) 28(5.7,0) 29(5.7,0.8) 30(5.7,1.6) 31(5.7,2.4) 32(5.7,3.2) 33(5.7,4)
  rect 0.55x1.5 smd: 12(-4,-5.7) 13(-3.2,-5.7) 14(-2.4,-5.7) 15(-1.6,-5.7) 16(-0.8,-5.7) 17(0,-5.7) 18(0.8,-5.7) 19(1.6,-5.7) 20(2.4,-5.7) 21(3.2,-5.7) 22(4,-5.7) 34(4,5.7) 35(3.2,5.7) 36(2.4,5.7) 37(1.6,5.7) 38(0.8,5.7) 39(0,5.7) 40(-0.8,5.7) 41(-1.6,5.7) 42(-2.4,5.7) 43(-3.2,5.7) 44(-4,5.7)
Top Overlay:
  circle w0.5: c-3.7,3.7 r0.25
  circle w0.25: c-6.2,4.8 r0.125
  lines w0.2: -4.6,-4.6 -4.6,4.6 4.6,4.6 4.6,-4.6 -4.6,-4.6
Mechanical 14:
  circle w0.1: c-3.95,3.95 r0.5
  lines w0.1: -5,-5 -5,5 5,5 5,-5 -5,-5
Mechanical 15:
  circle w0.05: c0,0 r0.35
  lines w0.05: -0.5,0 0.5,0 ; 0,-0.5 0,0.5 ; -6.7,-6.7 -6.7,6.7 6.7,6.7 6.7,-6.7 -6.7,-6.7
3D body "QFP80P1200X1200X120-44N.stp": height 1.2, standoff 0, extent -6.016,-6.016 6.016,6.016

## QFP80P1200X1200X160-44N [mm] "QFP, 0.80mm Pitch, Square; 44 Pin, 10.00mm L X 10.00mm W X 1.60mm H body, IPC Medium Density"
height 1.6
pads (44):
  rect 1.5x0.55 smd: 1(-5.7,4) 2(-5.7,3.2) 3(-5.7,2.4) 4(-5.7,1.6) 5(-5.7,0.8) 6(-5.7,0) 7(-5.7,-0.8) 8(-5.7,-1.6) 9(-5.7,-2.4) 10(-5.7,-3.2) 11(-5.7,-4) 23(5.7,-4) 24(5.7,-3.2) 25(5.7,-2.4) 26(5.7,-1.6) 27(5.7,-0.8) 28(5.7,0) 29(5.7,0.8) 30(5.7,1.6) 31(5.7,2.4) 32(5.7,3.2) 33(5.7,4)
  rect 0.55x1.5 smd: 12(-4,-5.7) 13(-3.2,-5.7) 14(-2.4,-5.7) 15(-1.6,-5.7) 16(-0.8,-5.7) 17(0,-5.7) 18(0.8,-5.7) 19(1.6,-5.7) 20(2.4,-5.7) 21(3.2,-5.7) 22(4,-5.7) 34(4,5.7) 35(3.2,5.7) 36(2.4,5.7) 37(1.6,5.7) 38(0.8,5.7) 39(0,5.7) 40(-0.8,5.7) 41(-1.6,5.7) 42(-2.4,5.7) 43(-3.2,5.7) 44(-4,5.7)
Top Overlay:
  circle w0.5: c-3.7,3.7 r0.25
  circle w0.25: c-6.2,4.8 r0.125
  lines w0.2: -4.6,-4.6 -4.6,4.6 4.6,4.6 4.6,-4.6 -4.6,-4.6
Mechanical 14:
  circle w0.1: c-3.95,3.95 r0.5
  lines w0.1: -5,-5 -5,5 5,5 5,-5 -5,-5
Mechanical 15:
  circle w0.05: c0,0 r0.35
  lines w0.05: -0.5,0 0.5,0 ; 0,-0.5 0,0.5 ; -6.7,-6.7 -6.7,6.7 6.7,6.7 6.7,-6.7 -6.7,-6.7
3D body "QFP80P1200X1200X160-44N.stp": height 1.6, standoff 0, extent -6.016,-6.016 6.016,6.016